# Altium schematic symbol library TI - ADC.SchLib: 2198 symbols (part 16 of 130)
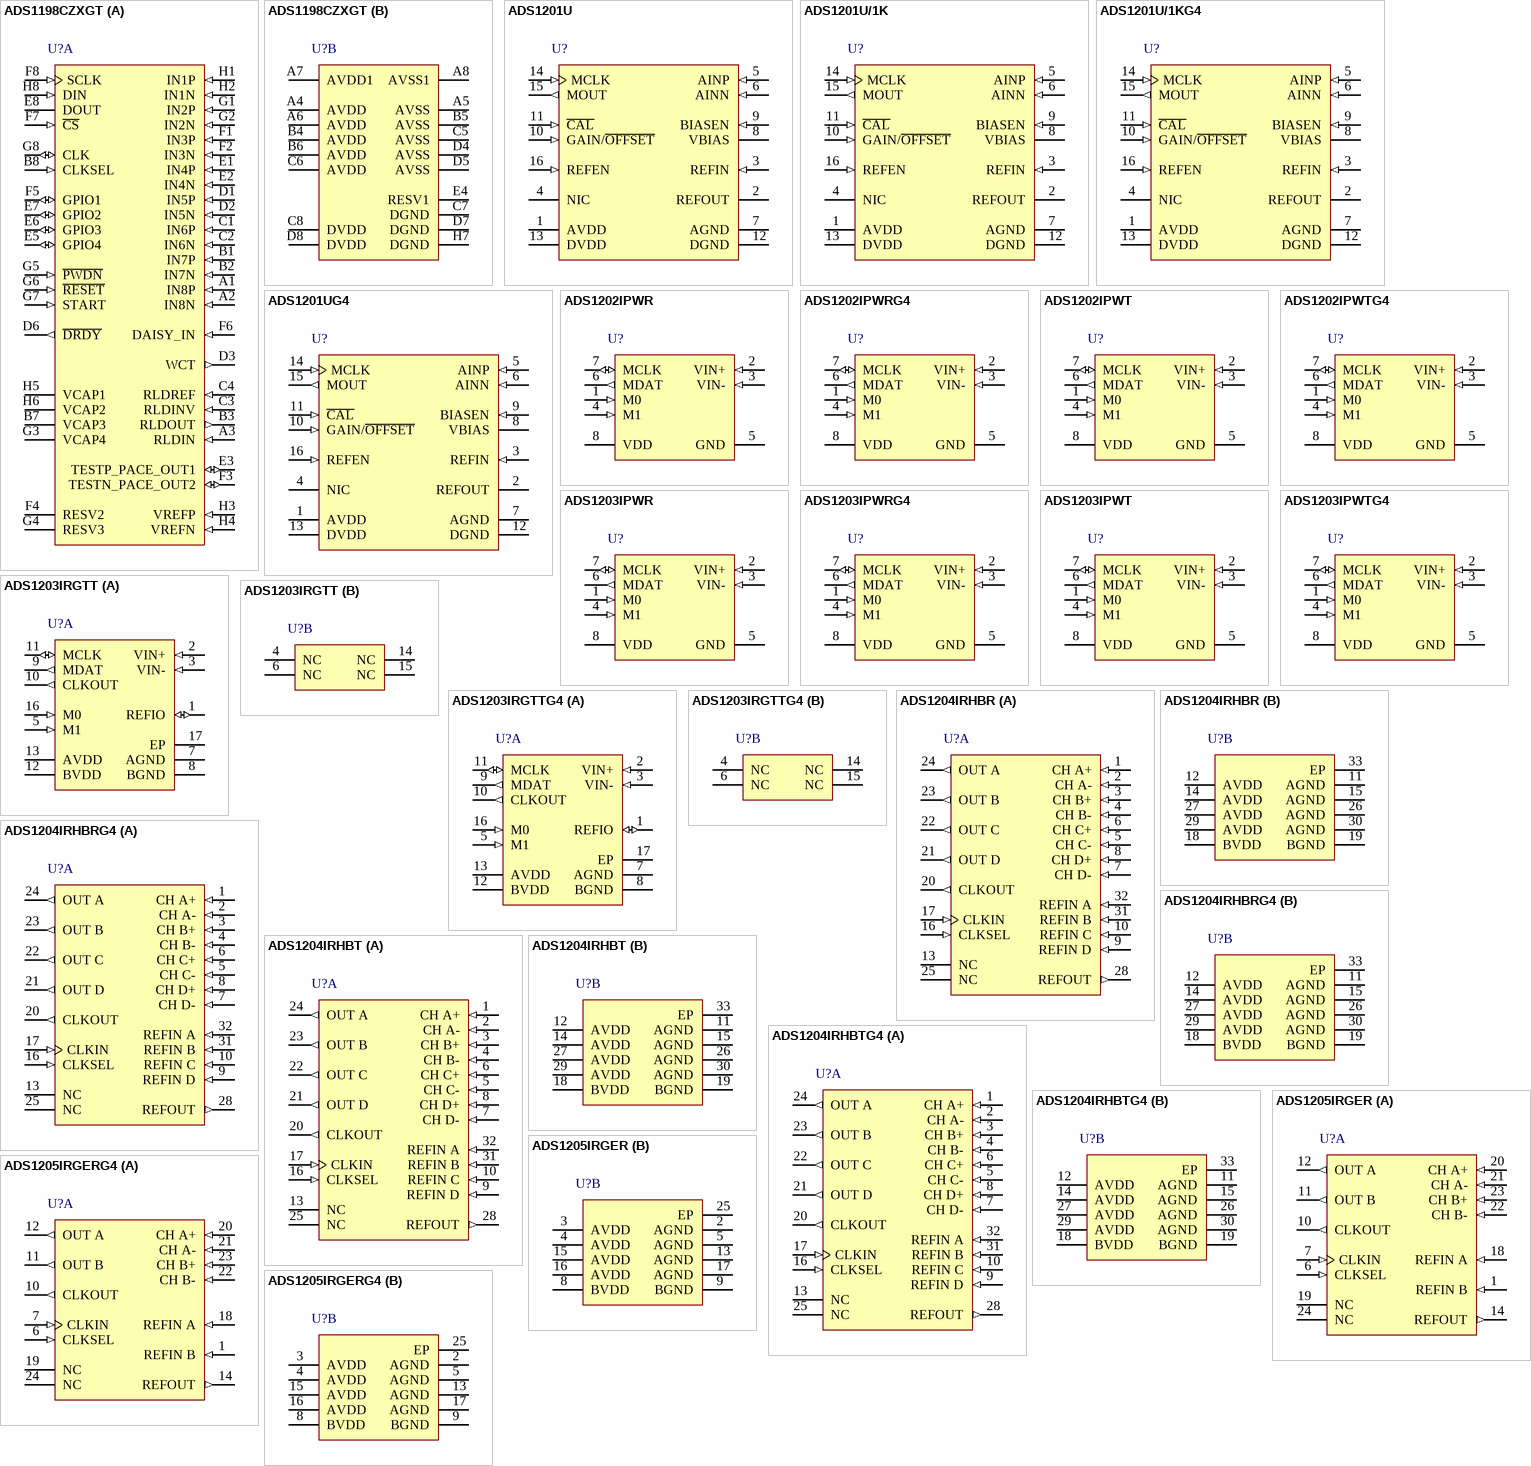
[diagram p141: symbols ADS1198CZXGT to ADS1205IRGERG4]

## ADS1201U/1KG4
designator U?
High Dynamic Range Delta-Sigma Modulator, -40 to 85 degC, 16-pin SOIC (DW16), Green (RoHS & no Sb/Br); Manufacturer: Texas Instruments; PartNumber: ADS1201U/1KG4; # Input Channels: 1; Analog Voltage AV/DD(Max)(V): 5.25; Analog Voltage AV/DD(Min)(V): 4.75; Architecture: Delta-Sigma, Modulator; Resolution(Bits): 24; Sample Rate (max)(SPS): 1k; SubFamily: Precision ADC (<=10MSPS); DatasheetVersion: SBAS081; PackageVersion: 4040000-2/G, 01/2011; PackageReference: DW16; PackageDescription: 16-Pin Plastic Small Outline, Body 10.30 x 7.50 mm, Pitch 1.27 mm; Supplier 1: Digi-Key; Supplier Part Number 1: TLV1504IPWR-ND; Digital Supply(Max)(V): 5.25; Digital Supply(Min)(V): 4.75; Eco-Plan: Green (RoHS & no Sb/Br); Mounting Technology: Surface Mount; Code_JEDEC: MS-013; ComponentLink1Description: Manufacturer URL; ComponentLink1URL: http://www.ti.com/; ComponentLink2Description: Datasheet; ComponentLink2URL: http://www.ti.com/general/docs/lit/getliterature.tsp?genericPartNumber=ADS1201&fileType=pdf; ComponentLink3Description: Package Specification; ComponentLink3URL: http://www.ti.com/litv/pdf/msoi003g
footprint TI-DW16_N (SOIC, 16-Leads, Body 10.3x7.5mm, Pitch 1.27mm, IPC Medium Density)
footprint TI-DW16_L (SOIC, 16-Leads, Body 10.3x7.5mm, Pitch 1.27mm, IPC High Density)
footprint TI-DW16_M (SOIC, 16-Leads, Body 10.3x7.5mm, Pitch 1.27mm, IPC Low Density)
pins: 1 AVDD (power) "Analog Input: Analog Supply, +5V nominal.", 2 REFOUT (hiz) "Analog Output: Internal Reference Voltage Output: +2.5V nominal", 3 REFIN (in) "Analog Input: Reference Voltage Input.", 4 NIC "Not Internally Connected.", 5 AINP (in) "Analog Input: Noninverting Input.", 6 AINN (in) "Analog Input: Inverting Input.", 7 AGND (power) "Analog Input: Analog Ground.", 8 VBIAS (hiz) "Analog Output: Bias Voltage Output, nominally +3.3V (with +2.5V reference).", 9 BIASEN (in) "Digital Input: Bias Voltage Enable Input (HIGH = enabled, LOW = disabled).", 10 GAIN/~{OFFSET} (in) "Digital Input: Gain/Offset Calibration Select Input (with CAL LOW; HIGH = gain configuration, LOW = offset configuration).", 11 ~{CAL} (in) "Digital Input: Calibration Control Input (HIGH = normal operation, LOW = gain or offset", 12 DGND (power) "Digital Input: Digital Ground.", 13 DVDD (power) "Digital Input: Digital Supply, +5V nominal.", 14 MCLK (in) "Digital Input: Modulator Clock Input. CMOS compatible.", 15 MOUT (out) "Digital Output: Modulator Output.", 16 REFEN (in) "Digital Input: REFOUT Voltage Enable Input (HIGH = enabled, LOW = disabled)."

## ADS1201UG4
designator U?
High Dynamic Range Delta-Sigma Modulator, -40 to 85 degC, 16-pin SOIC (DW16), Green (RoHS & no Sb/Br); Manufacturer: Texas Instruments; PartNumber: ADS1201UG4; # Input Channels: 1; Analog Voltage AV/DD(Max)(V): 5.25; Analog Voltage AV/DD(Min)(V): 4.75; Architecture: Delta-Sigma, Modulator; Resolution(Bits): 24; Sample Rate (max)(SPS): 1k; SubFamily: Precision ADC (<=10MSPS); DatasheetVersion: SBAS081; PackageVersion: 4040000-2/G, 01/2011; PackageReference: DW16; PackageDescription: 16-Pin Plastic Small Outline, Body 10.30 x 7.50 mm, Pitch 1.27 mm; Supplier 1: Digi-Key; Supplier Part Number 1: TLV1504IPWRG4-ND; Digital Supply(Max)(V): 5.25; Digital Supply(Min)(V): 4.75; Eco-Plan: Green (RoHS & no Sb/Br); Mounting Technology: Surface Mount; Code_JEDEC: MS-013; ComponentLink1Description: Manufacturer URL; ComponentLink1URL: http://www.ti.com/; ComponentLink2Description: Datasheet; ComponentLink2URL: http://www.ti.com/general/docs/lit/getliterature.tsp?genericPartNumber=ADS1201&fileType=pdf; ComponentLink3Description: Package Specification; ComponentLink3URL: http://www.ti.com/litv/pdf/msoi003g
footprint TI-DW16_N (SOIC, 16-Leads, Body 10.3x7.5mm, Pitch 1.27mm, IPC Medium Density)
footprint TI-DW16_L (SOIC, 16-Leads, Body 10.3x7.5mm, Pitch 1.27mm, IPC High Density)
footprint TI-DW16_M (SOIC, 16-Leads, Body 10.3x7.5mm, Pitch 1.27mm, IPC Low Density)
pins: 1 AVDD (power) "Analog Input: Analog Supply, +5V nominal.", 2 REFOUT (hiz) "Analog Output: Internal Reference Voltage Output: +2.5V nominal", 3 REFIN (in) "Analog Input: Reference Voltage Input.", 4 NIC "Not Internally Connected.", 5 AINP (in) "Analog Input: Noninverting Input.", 6 AINN (in) "Analog Input: Inverting Input.", 7 AGND (power) "Analog Input: Analog Ground.", 8 VBIAS (hiz) "Analog Output: Bias Voltage Output, nominally +3.3V (with +2.5V reference).", 9 BIASEN (in) "Digital Input: Bias Voltage Enable Input (HIGH = enabled, LOW = disabled).", 10 GAIN/~{OFFSET} (in) "Digital Input: Gain/Offset Calibration Select Input (with CAL LOW; HIGH = gain configuration, LOW = offset configuration).", 11 ~{CAL} (in) "Digital Input: Calibration Control Input (HIGH = normal operation, LOW = gain or offset", 12 DGND (power) "Digital Input: Digital Ground.", 13 DVDD (power) "Digital Input: Digital Supply, +5V nominal.", 14 MCLK (in) "Digital Input: Modulator Clock Input. CMOS compatible.", 15 MOUT (out) "Digital Output: Modulator Output.", 16 REFEN (in) "Digital Input: REFOUT Voltage Enable Input (HIGH = enabled, LOW = disabled)."

## ADS1202IPWR
designator U?
Current Shunt Delta-Sigma Modulator, 10 MHz CLK, + / - 250 mV Input, 16-Bit Resolution, -40 to 85 degC, 8-pin SOP (PW8), Green (RoHS & no Sb/Br); Manufacturer: Texas Instruments; PartNumber: ADS1202IPWR; # Input Channels: 1; Analog Voltage AV/DD(Max)(V): 5.25; Analog Voltage AV/DD(Min)(V): 4.75; Architecture: Delta-Sigma, Modulator; INL(Max)(+/-LSB): 12; Resolution(Bits): 16; Sample Rate (max)(SPS): 40k; SFDR(dB): 84; SINAD(dB): 70; SNR(dB): 70.5; SubFamily: Precision ADC (<=10MSPS); DatasheetVersion: SBAS275B; PackageVersion: 4040064-2/G, 02/2011; PackageReference: PW8; PackageDescription: 8-Pin Plastic Small Outline, Body 4.4 x 3 mm, Pitch 0.65 mm; Supplier 1: Digi-Key; Supplier Part Number 1: 296-2914-5-ND; Digital Supply(Max)(V): 5.25; Digital Supply(Min)(V): 4.75; Eco-Plan: Green (RoHS & no Sb/Br); Mounting Technology: Surface Mount; Code_JEDEC: MO-153; ComponentLink1Description: Manufacturer URL; ComponentLink1URL: http://www.ti.com/; ComponentLink2Description: Datasheet; ComponentLink2URL: http://www.ti.com/general/docs/lit/getliterature.tsp?genericPartNumber=ADS1202&fileType=pdf; ComponentLink3Description: Package Specification; ComponentLink3URL: http://www.ti.com/litv/pdf/mtss001d
footprint TI-PW8_N (SOP, 8-Leads, Body 4.4x3mm, Pitch 0.65mm, IPC Medium Density)
footprint TI-PW8_L (SOP, 8-Leads, Body 4.4x3mm, Pitch 0.65mm, IPC High Density)
footprint TI-PW8_M (SOP, 8-Leads, Body 4.4x3mm, Pitch 0.65mm, IPC Low Density)
pins: 1 M0 (in) "Mode input", 2 VIN+ (in) "Noninverting analog input", 3 VIN- (in) "Inverting analog input", 4 M1 (in) "Mode input", 5 GND (power) "Power supply ground", 6 MDAT (out) "Modulator data output", 7 MCLK (io) "Modulator clock input or output", 8 VDD (power) "Power supply: +5V nominal"

## ADS1202IPWRG4
designator U?
Current Shunt Delta-Sigma Modulator, 10 MHz CLK, + / - 250 mV Input, 16-Bit Resolution, -40 to 85 degC, 8-pin SOP (PW8), Green (RoHS & no Sb/Br); Manufacturer: Texas Instruments; PartNumber: ADS1202IPWRG4; # Input Channels: 1; Analog Voltage AV/DD(Max)(V): 5.25; Analog Voltage AV/DD(Min)(V): 4.75; Architecture: Delta-Sigma, Modulator; INL(Max)(+/-LSB): 12; Resolution(Bits): 16; Sample Rate (max)(SPS): 40k; SFDR(dB): 84; SINAD(dB): 70; SNR(dB): 70.5; SubFamily: Precision ADC (<=10MSPS); DatasheetVersion: SBAS275B; PackageVersion: 4040064-2/G, 02/2011; PackageReference: PW8; PackageDescription: 8-Pin Plastic Small Outline, Body 4.4 x 3 mm, Pitch 0.65 mm; Supplier 1: Digi-Key; Supplier Part Number 1: TLC2554IPWG4-ND; Digital Supply(Max)(V): 5.25; Digital Supply(Min)(V): 4.75; Eco-Plan: Green (RoHS & no Sb/Br); Mounting Technology: Surface Mount; Code_JEDEC: MO-153; ComponentLink1Description: Manufacturer URL; ComponentLink1URL: http://www.ti.com/; ComponentLink2Description: Datasheet; ComponentLink2URL: http://www.ti.com/general/docs/lit/getliterature.tsp?genericPartNumber=ADS1202&fileType=pdf; ComponentLink3Description: Package Specification; ComponentLink3URL: http://www.ti.com/litv/pdf/mtss001d
footprint TI-PW8_N (SOP, 8-Leads, Body 4.4x3mm, Pitch 0.65mm, IPC Medium Density)
footprint TI-PW8_L (SOP, 8-Leads, Body 4.4x3mm, Pitch 0.65mm, IPC High Density)
footprint TI-PW8_M (SOP, 8-Leads, Body 4.4x3mm, Pitch 0.65mm, IPC Low Density)
pins: 1 M0 (in) "Mode input", 2 VIN+ (in) "Noninverting analog input", 3 VIN- (in) "Inverting analog input", 4 M1 (in) "Mode input", 5 GND (power) "Power supply ground", 6 MDAT (out) "Modulator data output", 7 MCLK (io) "Modulator clock input or output", 8 VDD (power) "Power supply: +5V nominal"

## ADS1202IPWT
designator U?
Current Shunt Delta-Sigma Modulator, 10 MHz CLK, + / - 250 mV Input, 16-Bit Resolution, -40 to 85 degC, 8-pin SOP (PW8), Green (RoHS & no Sb/Br); Manufacturer: Texas Instruments; PartNumber: ADS1202IPWT; # Input Channels: 1; Analog Voltage AV/DD(Max)(V): 5.25; Analog Voltage AV/DD(Min)(V): 4.75; Architecture: Delta-Sigma, Modulator; INL(Max)(+/-LSB): 12; Resolution(Bits): 16; Sample Rate (max)(SPS): 40k; SFDR(dB): 84; SINAD(dB): 70; SNR(dB): 70.5; SubFamily: Precision ADC (<=10MSPS); DatasheetVersion: SBAS275B; PackageVersion: 4040064-2/G, 02/2011; PackageReference: PW8; PackageDescription: 8-Pin Plastic Small Outline, Body 4.4 x 3 mm, Pitch 0.65 mm; Supplier 1: Digi-Key; Supplier Part Number 1: 296-18679-5-ND; Digital Supply(Max)(V): 5.25; Digital Supply(Min)(V): 4.75; Eco-Plan: Green (RoHS & no Sb/Br); Mounting Technology: Surface Mount; Code_JEDEC: MO-153; ComponentLink1Description: Manufacturer URL; ComponentLink1URL: http://www.ti.com/; ComponentLink2Description: Datasheet; ComponentLink2URL: http://www.ti.com/general/docs/lit/getliterature.tsp?genericPartNumber=ADS1202&fileType=pdf; ComponentLink3Description: Package Specification; ComponentLink3URL: http://www.ti.com/litv/pdf/mtss001d
footprint TI-PW8_N (SOP, 8-Leads, Body 4.4x3mm, Pitch 0.65mm, IPC Medium Density)
footprint TI-PW8_L (SOP, 8-Leads, Body 4.4x3mm, Pitch 0.65mm, IPC High Density)
footprint TI-PW8_M (SOP, 8-Leads, Body 4.4x3mm, Pitch 0.65mm, IPC Low Density)
pins: 1 M0 (in) "Mode input", 2 VIN+ (in) "Noninverting analog input", 3 VIN- (in) "Inverting analog input", 4 M1 (in) "Mode input", 5 GND (power) "Power supply ground", 6 MDAT (out) "Modulator data output", 7 MCLK (io) "Modulator clock input or output", 8 VDD (power) "Power supply: +5V nominal"

## ADS1202IPWTG4
designator U?
Current Shunt Delta-Sigma Modulator, 10 MHz CLK, + / - 250 mV Input, 16-Bit Resolution, -40 to 85 degC, 8-pin SOP (PW8), Green (RoHS & no Sb/Br); Manufacturer: Texas Instruments; PartNumber: ADS1202IPWTG4; # Input Channels: 1; Analog Voltage AV/DD(Max)(V): 5.25; Analog Voltage AV/DD(Min)(V): 4.75; Architecture: Delta-Sigma, Modulator; INL(Max)(+/-LSB): 12; Resolution(Bits): 16; Sample Rate (max)(SPS): 40k; SFDR(dB): 84; SINAD(dB): 70; SNR(dB): 70.5; SubFamily: Precision ADC (<=10MSPS); DatasheetVersion: SBAS275B; PackageVersion: 4040064-2/G, 02/2011; PackageReference: PW8; PackageDescription: 8-Pin Plastic Small Outline, Body 4.4 x 3 mm, Pitch 0.65 mm; Supplier 1: Digi-Key; Supplier Part Number 1: ADS8508IBDWG4-ND; Digital Supply(Max)(V): 5.25; Digital Supply(Min)(V): 4.75; Eco-Plan: Green (RoHS & no Sb/Br); Mounting Technology: Surface Mount; Code_JEDEC: MO-153; ComponentLink1Description: Manufacturer URL; ComponentLink1URL: http://www.ti.com/; ComponentLink2Description: Datasheet; ComponentLink2URL: http://www.ti.com/general/docs/lit/getliterature.tsp?genericPartNumber=ADS1202&fileType=pdf; ComponentLink3Description: Package Specification; ComponentLink3URL: http://www.ti.com/litv/pdf/mtss001d
footprint TI-PW8_N (SOP, 8-Leads, Body 4.4x3mm, Pitch 0.65mm, IPC Medium Density)
footprint TI-PW8_L (SOP, 8-Leads, Body 4.4x3mm, Pitch 0.65mm, IPC High Density)
footprint TI-PW8_M (SOP, 8-Leads, Body 4.4x3mm, Pitch 0.65mm, IPC Low Density)
pins: 1 M0 (in) "Mode input", 2 VIN+ (in) "Noninverting analog input", 3 VIN- (in) "Inverting analog input", 4 M1 (in) "Mode input", 5 GND (power) "Power supply ground", 6 MDAT (out) "Modulator data output", 7 MCLK (io) "Modulator clock input or output", 8 VDD (power) "Power supply: +5V nominal"

## ADS1203IPWR
designator U?
Current Shunt Delta-Sigma Modulator, 10 MHz CLK, + / - 250 mV Input, 16-Bit Resolution, -40 to 125 degC, 8-pin SOP (PW8), Green (RoHS & no Sb/Br); Manufacturer: Texas Instruments; PartNumber: ADS1203IPWR; # Input Channels: 1; Analog Voltage AV/DD(Max)(V): 5.5; Analog Voltage AV/DD(Min)(V): 4.5; Architecture: Delta-Sigma, Modulator; INL(Max)(+/-LSB): 4; Resolution(Bits): 16; Sample Rate (max)(SPS): 40k; SFDR(dB): 95; SINAD(dB): 85; SubFamily: Precision ADC (<=10MSPS); DatasheetVersion: SBAS318C; PackageVersion: 4040064-2/G, 02/2011; PackageReference: PW8; PackageDescription: 8-Pin Plastic Small Outline, Body 4.4 x 3 mm, Pitch 0.65 mm; Supplier 1: Digi-Key; Supplier Part Number 1: ADS8508IBDWR-ND; Digital Supply(Max)(V): 5.5; Digital Supply(Min)(V): 4.5; Eco-Plan: Green (RoHS & no Sb/Br); SNR(dB): 85; Mounting Technology: Surface Mount; Code_JEDEC: MO-153; ComponentLink1Description: Manufacturer URL; ComponentLink1URL: http://www.ti.com/; ComponentLink2Description: Datasheet; ComponentLink2URL: http://www.ti.com/general/docs/lit/getliterature.tsp?genericPartNumber=ADS1203&fileType=pdf; ComponentLink3Description: Package Specification; ComponentLink3URL: http://www.ti.com/litv/pdf/mtss001d
footprint TI-PW8_N (SOP, 8-Leads, Body 4.4x3mm, Pitch 0.65mm, IPC Medium Density)
footprint TI-PW8_L (SOP, 8-Leads, Body 4.4x3mm, Pitch 0.65mm, IPC High Density)
footprint TI-PW8_M (SOP, 8-Leads, Body 4.4x3mm, Pitch 0.65mm, IPC Low Density)
pins: 1 M0 (in) "Mode input", 2 VIN+ (in) "Noninverting analog input", 3 VIN- (in) "Inverting analog input", 4 M1 (in) "Mode input", 5 GND (power) "Power supply ground", 6 MDAT (out) "Modulator data output", 7 MCLK (io) "Modulator clock input or output", 8 VDD (power) "Power supply: +5V nominal"

## ADS1203IPWRG4
designator U?
Current Shunt Delta-Sigma Modulator, 10 MHz CLK, + / - 250 mV Input, 16-Bit Resolution, -40 to 125 degC, 8-pin SOP (PW8), Green (RoHS & no Sb/Br); Manufacturer: Texas Instruments; PartNumber: ADS1203IPWRG4; # Input Channels: 1; Analog Voltage AV/DD(Max)(V): 5.5; Analog Voltage AV/DD(Min)(V): 4.5; Architecture: Delta-Sigma, Modulator; INL(Max)(+/-LSB): 4; Resolution(Bits): 16; Sample Rate (max)(SPS): 40k; SFDR(dB): 95; SINAD(dB): 85; SubFamily: Precision ADC (<=10MSPS); DatasheetVersion: SBAS318C; PackageVersion: 4040064-2/G, 02/2011; PackageReference: PW8; PackageDescription: 8-Pin Plastic Small Outline, Body 4.4 x 3 mm, Pitch 0.65 mm; Supplier 1: Digi-Key; Supplier Part Number 1: ADS8508IBDWRG4-ND; Digital Supply(Max)(V): 5.5; Digital Supply(Min)(V): 4.5; Eco-Plan: Green (RoHS & no Sb/Br); SNR(dB): 85; Mounting Technology: Surface Mount; Code_JEDEC: MO-153; ComponentLink1Description: Manufacturer URL; ComponentLink1URL: http://www.ti.com/; ComponentLink2Description: Datasheet; ComponentLink2URL: http://www.ti.com/general/docs/lit/getliterature.tsp?genericPartNumber=ADS1203&fileType=pdf; ComponentLink3Description: Package Specification; ComponentLink3URL: http://www.ti.com/litv/pdf/mtss001d
footprint TI-PW8_N (SOP, 8-Leads, Body 4.4x3mm, Pitch 0.65mm, IPC Medium Density)
footprint TI-PW8_L (SOP, 8-Leads, Body 4.4x3mm, Pitch 0.65mm, IPC High Density)
footprint TI-PW8_M (SOP, 8-Leads, Body 4.4x3mm, Pitch 0.65mm, IPC Low Density)
pins: 1 M0 (in) "Mode input", 2 VIN+ (in) "Noninverting analog input", 3 VIN- (in) "Inverting analog input", 4 M1 (in) "Mode input", 5 GND (power) "Power supply ground", 6 MDAT (out) "Modulator data output", 7 MCLK (io) "Modulator clock input or output", 8 VDD (power) "Power supply: +5V nominal"

## ADS1203IPWT
designator U?
Current Shunt Delta-Sigma Modulator, 10 MHz CLK, + / - 250 mV Input, 16-Bit Resolution, -40 to 125 degC, 8-pin SOP (PW8), Green (RoHS & no Sb/Br); Manufacturer: Texas Instruments; PartNumber: ADS1203IPWT; # Input Channels: 1; Analog Voltage AV/DD(Max)(V): 5.5; Analog Voltage AV/DD(Min)(V): 4.5; Architecture: Delta-Sigma, Modulator; INL(Max)(+/-LSB): 4; Resolution(Bits): 16; Sample Rate (max)(SPS): 40k; SFDR(dB): 95; SINAD(dB): 85; SubFamily: Precision ADC (<=10MSPS); DatasheetVersion: SBAS318C; PackageVersion: 4040064-2/G, 02/2011; PackageReference: PW8; PackageDescription: 8-Pin Plastic Small Outline, Body 4.4 x 3 mm, Pitch 0.65 mm; Supplier 1: Digi-Key; Supplier Part Number 1: 296-18085-5-ND; Digital Supply(Max)(V): 5.5; Digital Supply(Min)(V): 4.5; Eco-Plan: Green (RoHS & no Sb/Br); SNR(dB): 85; Mounting Technology: Surface Mount; Code_JEDEC: MO-153; ComponentLink1Description: Manufacturer URL; ComponentLink1URL: http://www.ti.com/; ComponentLink2Description: Datasheet; ComponentLink2URL: http://www.ti.com/general/docs/lit/getliterature.tsp?genericPartNumber=ADS1203&fileType=pdf; ComponentLink3Description: Package Specification; ComponentLink3URL: http://www.ti.com/litv/pdf/mtss001d
footprint TI-PW8_N (SOP, 8-Leads, Body 4.4x3mm, Pitch 0.65mm, IPC Medium Density)
footprint TI-PW8_L (SOP, 8-Leads, Body 4.4x3mm, Pitch 0.65mm, IPC High Density)
footprint TI-PW8_M (SOP, 8-Leads, Body 4.4x3mm, Pitch 0.65mm, IPC Low Density)
pins: 1 M0 (in) "Mode input", 2 VIN+ (in) "Noninverting analog input", 3 VIN- (in) "Inverting analog input", 4 M1 (in) "Mode input", 5 GND (power) "Power supply ground", 6 MDAT (out) "Modulator data output", 7 MCLK (io) "Modulator clock input or output", 8 VDD (power) "Power supply: +5V nominal"

## ADS1203IPWTG4
designator U?
Current Shunt Delta-Sigma Modulator, 10 MHz CLK, + / - 250 mV Input, 16-Bit Resolution, -40 to 125 degC, 8-pin SOP (PW8), Green (RoHS & no Sb/Br); Manufacturer: Texas Instruments; PartNumber: ADS1203IPWTG4; # Input Channels: 1; Analog Voltage AV/DD(Max)(V): 5.5; Analog Voltage AV/DD(Min)(V): 4.5; Architecture: Delta-Sigma, Modulator; INL(Max)(+/-LSB): 4; Resolution(Bits): 16; Sample Rate (max)(SPS): 40k; SFDR(dB): 95; SINAD(dB): 85; SubFamily: Precision ADC (<=10MSPS); DatasheetVersion: SBAS318C; PackageVersion: 4040064-2/G, 02/2011; PackageReference: PW8; PackageDescription: 8-Pin Plastic Small Outline, Body 4.4 x 3 mm, Pitch 0.65 mm; Supplier 1: Digi-Key; Supplier Part Number 1: ADS8509IBDWG4-ND; Digital Supply(Max)(V): 5.5; Digital Supply(Min)(V): 4.5; Eco-Plan: Green (RoHS & no Sb/Br); SNR(dB): 85; Mounting Technology: Surface Mount; Code_JEDEC: MO-153; ComponentLink1Description: Manufacturer URL; ComponentLink1URL: http://www.ti.com/; ComponentLink2Description: Datasheet; ComponentLink2URL: http://www.ti.com/general/docs/lit/getliterature.tsp?genericPartNumber=ADS1203&fileType=pdf; ComponentLink3Description: Package Specification; ComponentLink3URL: http://www.ti.com/litv/pdf/mtss001d
footprint TI-PW8_N (SOP, 8-Leads, Body 4.4x3mm, Pitch 0.65mm, IPC Medium Density)
footprint TI-PW8_L (SOP, 8-Leads, Body 4.4x3mm, Pitch 0.65mm, IPC High Density)
footprint TI-PW8_M (SOP, 8-Leads, Body 4.4x3mm, Pitch 0.65mm, IPC Low Density)
pins: 1 M0 (in) "Mode input", 2 VIN+ (in) "Noninverting analog input", 3 VIN- (in) "Inverting analog input", 4 M1 (in) "Mode input", 5 GND (power) "Power supply ground", 6 MDAT (out) "Modulator data output", 7 MCLK (io) "Modulator clock input or output", 8 VDD (power) "Power supply: +5V nominal"

## ADS1203IRGTT
designator U?
Current Shunt Delta-Sigma Modulator, 10 MHz CLK, + / - 250 mV Input, 16-Bit Resolution, -40 to 125 degC, 16-pin QFN (RGT16), Green (RoHS & no Sb/Br); Manufacturer: Texas Instruments; PartNumber: ADS1203IRGTT; # Input Channels: 1; Analog Voltage AV/DD(Max)(V): 5.5; Analog Voltage AV/DD(Min)(V): 4.5; Architecture: Delta-Sigma, Modulator; ENOB(Bits): 16; INL(Max)(+/-LSB): 4; Sample Rate (max)(SPS): 40k; SFDR(dB): 95; SINAD(dB): 85; SubFamily: Precision ADC (<=10MSPS); DatasheetVersion: SBAS318C; PackageVersion: 4203495/H, 10/2011; PackageReference: RGT16-1650X1650TP; PackageDescription: 16-Pin Plastic Flat Pack, Body 3 x 3 mm, Pitch 0.5 mm; Supplier 1: Digi-Key; Supplier Part Number 1: ADS8509IBDWR-ND; Digital Supply(Max)(V): 5.5; Digital Supply(Min)(V): 4.5; Eco-Plan: Green (RoHS & no Sb/Br); Resolution(Bits): 16; SNR(dB): 85; Mounting Technology: Surface Mount; Code_JEDEC: MO-220; ComponentLink1Description: Manufacturer URL; ComponentLink1URL: http://www.ti.com/; ComponentLink2Description: Datasheet; ComponentLink2URL: http://www.ti.com/general/docs/lit/getliterature.tsp?genericPartNumber=ADS1203&fileType=pdf; ComponentLink3Description: Package Specification; ComponentLink3URL: http://www.ti.com/litv/pdf/mpqf119g
footprint TI-RGT16-1650X1650TP_V (QFN, 16-Leads, Body 3x3mm, Pitch 0.5mm, Thermal Pad 1.65x1.65mm)
part A pins: 1 REFIO (io) "Reference voltage input/output", 2 VIN+ (in) "Noninverting analog input", 3 VIN- (in) "Inverting analog input", 5 M1 (in) "Mode input", 7 AGND (power) "Analog power-supply ground", 8 BGND (power) "Interface power-supply ground", 9 MDAT (out) "Modulator data output", 10 CLKOUT (out) "Modulator clock output (Mode 3 only)", 11 MCLK (io) "Modulator clock input or output", 12 BVDD (power) "Interface power supply", 13 AVDD (power) "Analog power supply", 16 M0 (in) "Mode input", 17 EP (power)
part B pins: 4 NC "Not connected", 6 NC "Not connected", 14 NC "Not connected", 15 NC "Not connected"

## ADS1203IRGTTG4
designator U?
Current Shunt Delta-Sigma Modulator, 10 MHz CLK, + / - 250 mV Input, 16-Bit Resolution, -40 to 125 degC, 16-pin QFN (RGT16), Green (RoHS & no Sb/Br); Manufacturer: Texas Instruments; PartNumber: ADS1203IRGTTG4; # Input Channels: 1; Analog Voltage AV/DD(Max)(V): 5.5; Analog Voltage AV/DD(Min)(V): 4.5; Architecture: Delta-Sigma, Modulator; ENOB(Bits): 16; INL(Max)(+/-LSB): 4; Sample Rate (max)(SPS): 40k; SFDR(dB): 95; SINAD(dB): 85; SubFamily: Precision ADC (<=10MSPS); DatasheetVersion: SBAS318C; PackageVersion: 4203495/H, 10/2011; PackageReference: RGT16-1650X1650TP; PackageDescription: 16-Pin Plastic Flat Pack, Body 3 x 3 mm, Pitch 0.5 mm; Supplier 1: Digi-Key; Supplier Part Number 1: ADS8509IBDWRG4-ND; Digital Supply(Max)(V): 5.5; Digital Supply(Min)(V): 4.5; Eco-Plan: Green (RoHS & no Sb/Br); Resolution(Bits): 16; SNR(dB): 85; Mounting Technology: Surface Mount; Code_JEDEC: MO-220; ComponentLink1Description: Manufacturer URL; ComponentLink1URL: http://www.ti.com/; ComponentLink2Description: Datasheet; ComponentLink2URL: http://www.ti.com/general/docs/lit/getliterature.tsp?genericPartNumber=ADS1203&fileType=pdf; ComponentLink3Description: Package Specification; ComponentLink3URL: http://www.ti.com/litv/pdf/mpqf119g
footprint TI-RGT16-1650X1650TP_V (QFN, 16-Leads, Body 3x3mm, Pitch 0.5mm, Thermal Pad 1.65x1.65mm)
part A pins: 1 REFIO (io) "Reference voltage input/output", 2 VIN+ (in) "Noninverting analog input", 3 VIN- (in) "Inverting analog input", 5 M1 (in) "Mode input", 7 AGND (power) "Analog power-supply ground", 8 BGND (power) "Interface power-supply ground", 9 MDAT (out) "Modulator data output", 10 CLKOUT (out) "Modulator clock output (Mode 3 only)", 11 MCLK (io) "Modulator clock input or output", 12 BVDD (power) "Interface power supply", 13 AVDD (power) "Analog power supply", 16 M0 (in) "Mode input", 17 EP (power)
part B pins: 4 NC "Not connected", 6 NC "Not connected", 14 NC "Not connected", 15 NC "Not connected"

## ADS1204IRHBR
designator U?
Four Delta-Sigma Modulator, 10 MHz CLK, 0 to 5 V Input, 16-Bit Resolution, -40 to 105 degC, 32-pin QFN (RHB32), Green (RoHS & no Sb/Br); Manufacturer: Texas Instruments; PartNumber: ADS1204IRHBR; # Input Channels: 4; Analog Voltage AV/DD(Max)(V): 5.5; Analog Voltage AV/DD(Min)(V): 4.5; Architecture: Delta-Sigma, Modulator; Digital Supply(Min)(V): 2.7; ENOB(Bits): 14.5; INL(Max)(+/-LSB): 3; Resolution(Bits): 16; Sample Rate (max)(SPS): 40k; SFDR(dB): 100; SINAD(dB): 89; SubFamily: Precision ADC (<=10MSPS); DatasheetVersion: SBAS301C; PackageVersion: 4204326/D, 06/2011; PackageReference: RHB32-3150X3150TP; PackageDescription: 32-Pin Plastic Flat Pack, Body 5 x 5 mm, Pitch 0.5 mm; Supplier 1: Digi-Key; Supplier Part Number 1: 296-18087-5-ND; Digital Supply(Max)(V): 5.5; Eco-Plan: Green (RoHS & no Sb/Br); SNR(dB): 89; Mounting Technology: Surface Mount; Code_JEDEC: MO-220; ComponentLink1Description: Manufacturer URL; ComponentLink1URL: http://www.ti.com/; ComponentLink2Description: Datasheet; ComponentLink2URL: http://www.ti.com/general/docs/lit/getliterature.tsp?genericPartNumber=ADS1204&fileType=pdf; ComponentLink3Description: Package Specification; ComponentLink3URL: http://www.ti.com/lit/ml/mpqf130c/mpqf130c.pdf
footprint TI-RHB32-3150X3150TP_V (QFN, 32-Leads, Body 5x5mm, Pitch 0.5mm, Thermal Pad 3.15x3.15mm)
part A pins: 1 CH A+ (in) "Analog input of channel A: noninverting input", 2 CH A- (in) "Analog input of channel A: inverting input", 3 CH B+ (in) "Analog input of channel B: noninverting input", 4 CH B- (in) "Analog input of channel B: inverting input", 5 CH C- (in) "Analog input of channel C: inverting input", 6 CH C+ (in) "Analog input of channel C: noninverting input", 7 CH D- (in) "Analog input of channel D: inverting input", 8 CH D+ (in) "Analog input of channel D: noninverting input", 9 REFIN D (in) "Reference voltage input of channel D: pin for external reference voltage", 10 REFIN C (in) "Reference voltage input of channel C: pin for external reference voltage", 13 NC "No connection; this pin is left unconnected", 16 CLKSEL (in) "Clock select between internal clock (CLKSEL = 1) or external clock (CLKSEL = 0)", 17 CLKIN (in) "External clock input", 20 CLKOUT (out) "System clock output", 21 OUT D (out) "Bit stream from channel D modulator", 22 OUT C (out) "Bit stream from channel C modulator", 23 OUT B (out) "Bit stream from channel B modulator", 24 OUT A (out) "Bit stream from channel A modulator", 25 NC "No connection; this pin is left unconnected", 28 REFOUT (out) "Reference voltage output: output pin of the internal reference source; nominal 2.5V", 31 REFIN B (in) "Reference voltage input of channel B: pin for external reference voltage", 32 REFIN A (in) "Reference voltage input of channel A: pin for external reference voltage"
part B pins: 11 AGND (power) "Analog ground", 12 AVDD (power) "Analog power supply; nominal 5V", 14 AVDD (power) "Analog power supply; nominal 5V", 15 AGND (power) "Analog ground", 18 BVDD (power) "Digital interface power supply; from 2.7V to 5.5V", 19 BGND (power) "Interface ground", 26 AGND (power) "Analog ground", 27 AVDD (power) "Analog power supply; nominal 5V", 29 AVDD (power) "Analog power supply; nominal 5V", 30 AGND (power) "Analog ground", 33 EP (power)

## ADS1204IRHBRG4
designator U?
Four Delta-Sigma Modulator, 10 MHz CLK, 0 to 5 V Input, 16-Bit Resolution, -40 to 105 degC, 32-pin QFN (RHB32), Green (RoHS & no Sb/Br); Manufacturer: Texas Instruments; PartNumber: ADS1204IRHBRG4; # Input Channels: 4; Analog Voltage AV/DD(Max)(V): 5.5; Analog Voltage AV/DD(Min)(V): 4.5; Architecture: Delta-Sigma, Modulator; Digital Supply(Min)(V): 2.7; ENOB(Bits): 14.5; INL(Max)(+/-LSB): 3; Resolution(Bits): 16; Sample Rate (max)(SPS): 40k; SFDR(dB): 100; SINAD(dB): 89; SubFamily: Precision ADC (<=10MSPS); DatasheetVersion: SBAS301C; PackageVersion: 4204326/D, 06/2011; PackageReference: RHB32-3150X3150TP; PackageDescription: 32-Pin Plastic Flat Pack, Body 5 x 5 mm, Pitch 0.5 mm; Supplier 1: Digi-Key; Supplier Part Number 1: ADS8509IDWG4-ND; Digital Supply(Max)(V): 5.5; Eco-Plan: Green (RoHS & no Sb/Br); SNR(dB): 89; Mounting Technology: Surface Mount; Code_JEDEC: MO-220; ComponentLink1Description: Manufacturer URL; ComponentLink1URL: http://www.ti.com/; ComponentLink2Description: Datasheet; ComponentLink2URL: http://www.ti.com/general/docs/lit/getliterature.tsp?genericPartNumber=ADS1204&fileType=pdf; ComponentLink3Description: Package Specification; ComponentLink3URL: http://www.ti.com/lit/ml/mpqf130c/mpqf130c.pdf
footprint TI-RHB32-3150X3150TP_V (QFN, 32-Leads, Body 5x5mm, Pitch 0.5mm, Thermal Pad 3.15x3.15mm)
part A pins: 1 CH A+ (in) "Analog input of channel A: noninverting input", 2 CH A- (in) "Analog input of channel A: inverting input", 3 CH B+ (in) "Analog input of channel B: noninverting input", 4 CH B- (in) "Analog input of channel B: inverting input", 5 CH C- (in) "Analog input of channel C: inverting input", 6 CH C+ (in) "Analog input of channel C: noninverting input", 7 CH D- (in) "Analog input of channel D: inverting input", 8 CH D+ (in) "Analog input of channel D: noninverting input", 9 REFIN D (in) "Reference voltage input of channel D: pin for external reference voltage", 10 REFIN C (in) "Reference voltage input of channel C: pin for external reference voltage", 13 NC "No connection; this pin is left unconnected", 16 CLKSEL (in) "Clock select between internal clock (CLKSEL = 1) or external clock (CLKSEL = 0)", 17 CLKIN (in) "External clock input", 20 CLKOUT (out) "System clock output", 21 OUT D (out) "Bit stream from channel D modulator", 22 OUT C (out) "Bit stream from channel C modulator", 23 OUT B (out) "Bit stream from channel B modulator", 24 OUT A (out) "Bit stream from channel A modulator", 25 NC "No connection; this pin is left unconnected", 28 REFOUT (out) "Reference voltage output: output pin of the internal reference source; nominal 2.5V", 31 REFIN B (in) "Reference voltage input of channel B: pin for external reference voltage", 32 REFIN A (in) "Reference voltage input of channel A: pin for external reference voltage"
part B pins: 11 AGND (power) "Analog ground", 12 AVDD (power) "Analog power supply; nominal 5V", 14 AVDD (power) "Analog power supply; nominal 5V", 15 AGND (power) "Analog ground", 18 BVDD (power) "Digital interface power supply; from 2.7V to 5.5V", 19 BGND (power) "Interface ground", 26 AGND (power) "Analog ground", 27 AVDD (power) "Analog power supply; nominal 5V", 29 AVDD (power) "Analog power supply; nominal 5V", 30 AGND (power) "Analog ground", 33 EP (power)

## ADS1204IRHBT
designator U?
Four Delta-Sigma Modulator, 10 MHz CLK, 0 to 5 V Input, 16-Bit Resolution, -40 to 105 degC, 32-pin QFN (RHB32), Green (RoHS & no Sb/Br); Manufacturer: Texas Instruments; PartNumber: ADS1204IRHBT; # Input Channels: 4; Analog Voltage AV/DD(Max)(V): 5.5; Analog Voltage AV/DD(Min)(V): 4.5; Architecture: Delta-Sigma, Modulator; Digital Supply(Min)(V): 2.7; ENOB(Bits): 14.5; INL(Max)(+/-LSB): 3; Resolution(Bits): 16; Sample Rate (max)(SPS): 40k; SFDR(dB): 100; SINAD(dB): 89; SubFamily: Precision ADC (<=10MSPS); DatasheetVersion: SBAS301C; PackageVersion: 4204326/D, 06/2011; PackageReference: RHB32-3150X3150TP; PackageDescription: 32-Pin Plastic Flat Pack, Body 5 x 5 mm, Pitch 0.5 mm; Supplier 1: Digi-Key; Supplier Part Number 1: ADS8509IDWR-ND; Digital Supply(Max)(V): 5.5; Eco-Plan: Green (RoHS & no Sb/Br); SNR(dB): 89; Mounting Technology: Surface Mount; Code_JEDEC: MO-220; ComponentLink1Description: Manufacturer URL; ComponentLink1URL: http://www.ti.com/; ComponentLink2Description: Datasheet; ComponentLink2URL: http://www.ti.com/general/docs/lit/getliterature.tsp?genericPartNumber=ADS1204&fileType=pdf; ComponentLink3Description: Package Specification; ComponentLink3URL: http://www.ti.com/lit/ml/mpqf130c/mpqf130c.pdf
footprint TI-RHB32-3150X3150TP_V (QFN, 32-Leads, Body 5x5mm, Pitch 0.5mm, Thermal Pad 3.15x3.15mm)
part A pins: 1 CH A+ (in) "Analog input of channel A: noninverting input", 2 CH A- (in) "Analog input of channel A: inverting input", 3 CH B+ (in) "Analog input of channel B: noninverting input", 4 CH B- (in) "Analog input of channel B: inverting input", 5 CH C- (in) "Analog input of channel C: inverting input", 6 CH C+ (in) "Analog input of channel C: noninverting input", 7 CH D- (in) "Analog input of channel D: inverting input", 8 CH D+ (in) "Analog input of channel D: noninverting input", 9 REFIN D (in) "Reference voltage input of channel D: pin for external reference voltage", 10 REFIN C (in) "Reference voltage input of channel C: pin for external reference voltage", 13 NC "No connection; this pin is left unconnected", 16 CLKSEL (in) "Clock select between internal clock (CLKSEL = 1) or external clock (CLKSEL = 0)", 17 CLKIN (in) "External clock input", 20 CLKOUT (out) "System clock output", 21 OUT D (out) "Bit stream from channel D modulator", 22 OUT C (out) "Bit stream from channel C modulator", 23 OUT B (out) "Bit stream from channel B modulator", 24 OUT A (out) "Bit stream from channel A modulator", 25 NC "No connection; this pin is left unconnected", 28 REFOUT (out) "Reference voltage output: output pin of the internal reference source; nominal 2.5V", 31 REFIN B (in) "Reference voltage input of channel B: pin for external reference voltage", 32 REFIN A (in) "Reference voltage input of channel A: pin for external reference voltage"
part B pins: 11 AGND (power) "Analog ground", 12 AVDD (power) "Analog power supply; nominal 5V", 14 AVDD (power) "Analog power supply; nominal 5V", 15 AGND (power) "Analog ground", 18 BVDD (power) "Digital interface power supply; from 2.7V to 5.5V", 19 BGND (power) "Interface ground", 26 AGND (power) "Analog ground", 27 AVDD (power) "Analog power supply; nominal 5V", 29 AVDD (power) "Analog power supply; nominal 5V", 30 AGND (power) "Analog ground", 33 EP (power)

## ADS1204IRHBTG4
designator U?
Four Delta-Sigma Modulator, 10 MHz CLK, 0 to 5 V Input, 16-Bit Resolution, -40 to 105 degC, 32-pin QFN (RHB32), Green (RoHS & no Sb/Br); Manufacturer: Texas Instruments; PartNumber: ADS1204IRHBTG4; # Input Channels: 4; Analog Voltage AV/DD(Max)(V): 5.5; Analog Voltage AV/DD(Min)(V): 4.5; Architecture: Delta-Sigma, Modulator; Digital Supply(Min)(V): 2.7; ENOB(Bits): 14.5; INL(Max)(+/-LSB): 3; Resolution(Bits): 16; Sample Rate (max)(SPS): 40k; SFDR(dB): 100; SINAD(dB): 89; SubFamily: Precision ADC (<=10MSPS); DatasheetVersion: SBAS301C; PackageVersion: 4204326/D, 06/2011; PackageReference: RHB32-3150X3150TP; PackageDescription: 32-Pin Plastic Flat Pack, Body 5 x 5 mm, Pitch 0.5 mm; Supplier 1: Digi-Key; Supplier Part Number 1: ADS8509IDWRG4-ND; Digital Supply(Max)(V): 5.5; Eco-Plan: Green (RoHS & no Sb/Br); SNR(dB): 89; Mounting Technology: Surface Mount; Code_JEDEC: MO-220; ComponentLink1Description: Manufacturer URL; ComponentLink1URL: http://www.ti.com/; ComponentLink2Description: Datasheet; ComponentLink2URL: http://www.ti.com/general/docs/lit/getliterature.tsp?genericPartNumber=ADS1204&fileType=pdf; ComponentLink3Description: Package Specification; ComponentLink3URL: http://www.ti.com/lit/ml/mpqf130c/mpqf130c.pdf
footprint TI-RHB32-3150X3150TP_V (QFN, 32-Leads, Body 5x5mm, Pitch 0.5mm, Thermal Pad 3.15x3.15mm)
part A pins: 1 CH A+ (in) "Analog input of channel A: noninverting input", 2 CH A- (in) "Analog input of channel A: inverting input", 3 CH B+ (in) "Analog input of channel B: noninverting input", 4 CH B- (in) "Analog input of channel B: inverting input", 5 CH C- (in) "Analog input of channel C: inverting input", 6 CH C+ (in) "Analog input of channel C: noninverting input", 7 CH D- (in) "Analog input of channel D: inverting input", 8 CH D+ (in) "Analog input of channel D: noninverting input", 9 REFIN D (in) "Reference voltage input of channel D: pin for external reference voltage", 10 REFIN C (in) "Reference voltage input of channel C: pin for external reference voltage", 13 NC "No connection; this pin is left unconnected", 16 CLKSEL (in) "Clock select between internal clock (CLKSEL = 1) or external clock (CLKSEL = 0)", 17 CLKIN (in) "External clock input", 20 CLKOUT (out) "System clock output", 21 OUT D (out) "Bit stream from channel D modulator", 22 OUT C (out) "Bit stream from channel C modulator", 23 OUT B (out) "Bit stream from channel B modulator", 24 OUT A (out) "Bit stream from channel A modulator", 25 NC "No connection; this pin is left unconnected", 28 REFOUT (out) "Reference voltage output: output pin of the internal reference source; nominal 2.5V", 31 REFIN B (in) "Reference voltage input of channel B: pin for external reference voltage", 32 REFIN A (in) "Reference voltage input of channel A: pin for external reference voltage"
part B pins: 11 AGND (power) "Analog ground", 12 AVDD (power) "Analog power supply; nominal 5V", 14 AVDD (power) "Analog power supply; nominal 5V", 15 AGND (power) "Analog ground", 18 BVDD (power) "Digital interface power supply; from 2.7V to 5.5V", 19 BGND (power) "Interface ground", 26 AGND (power) "Analog ground", 27 AVDD (power) "Analog power supply; nominal 5V", 29 AVDD (power) "Analog power supply; nominal 5V", 30 AGND (power) "Analog ground", 33 EP (power)
